# Altium footprint library Footprint-Lib-PhilsLab.PcbLib: 237 footprints (part 7 of 15)
Each footprint in its own frame and in the unit in brackets; x right, y up, seen from the top. Pads: shape width x height; smd on the part's side, far side on the other; paste and mask are expansions set on the pad; w line width, h text height; cw(c..) or ccw(c..) is an arc to the next point about the centre after c.
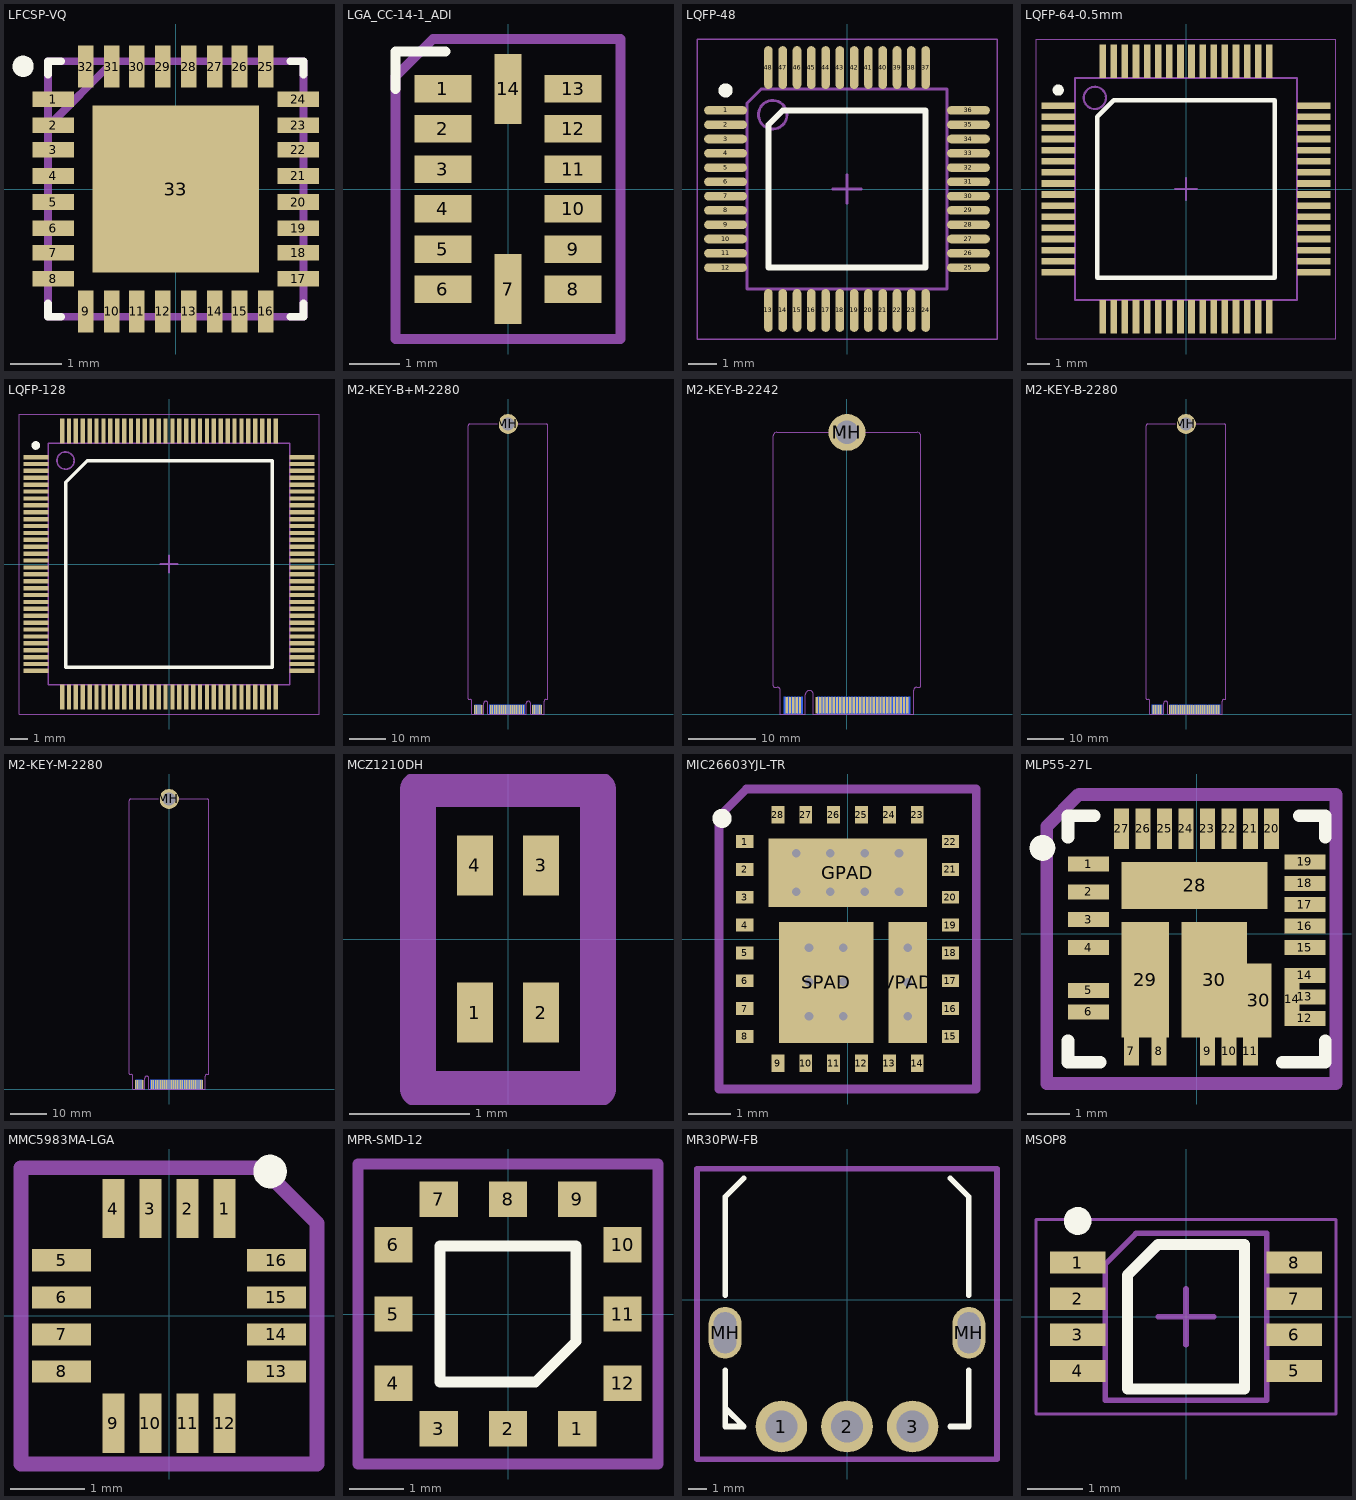
[diagram p6: the footprints below, top view; thin cyan lines are the x and y axes]

## LFCSP-VQ [mil]
pads (33):
  rect 32x12 smd mask+1.97: 1(-94,69) 2(-94,49) 3(-94,30) 4(-94,10) 5(-94,-10) 6(-94,-30) 7(-94,-49) 8(-94,-69) 17(94,-69) 18(94,-49) 19(94,-30) 20(94,-10) 21(94,10) 22(94,30) 23(94,49) 24(94,69)
  rect 12x32 smd mask+1.97: 9(-69,-94) 10(-49,-94) 11(-30,-94) 12(-10,-94) 13(10,-94) 14(30,-94) 15(49,-94) 16(69,-94) 25(69,94) 26(49,94) 27(30,94) 28(10,94) 29(-10,94) 30(-30,94) 31(-49,94) 32(-69,94)
  rect 128x128 smd mask+1.97: 33(0,0)
Top Overlay:
  circle w10: c-117.13,94.18 r3.15
  lines w6: -98,-88 -98,-98 -88,-98 ; -98,88 -98,98 -88,98 ; 88,-98 98,-98 98,-88 ; 88,98 98,98 98,88
Mechanical 13:
  lines w6: -98,-75 -98,-63 ; -98,-55 -98,-43 ; -98,-36 -98,-24 ; -98,-16 -98,-4 ; -98,4 -98,16 ; -98,24 -98,36 ; -98,43 -98,55 ; -98,48 -48,98 ; -98,63 -98,75 ; -75,-98 -63,-98 ; -75,98 -63,98 ; -55,-98 -43,-98 ; -55,98 -43,98 ; -36,-98 -24,-98 ; -36,98 -24,98 ; -16,-98 -4,-98 ; -16,98 -4,98 ; 4,-98 16,-98 ; 4,98 16,98 ; 24,-98 36,-98 ; 24,98 36,98 ; 43,-98 55,-98 ; 43,98 55,98 ; 63,-98 75,-98 ; 63,98 75,98 ; 98,-75 98,-63 ; 98,-55 98,-43 ; 98,-36 98,-24 ; 98,-16 98,-4 ; 98,4 98,16 ; 98,24 98,36 ; 98,43 98,55 ; 98,63 98,75 ; -98,-98 -98,98 98,98 98,-98 -98,-98
  text "'.Designator'" at -284.69,-42.8 h49.21
3D body "32-LFCSP-VQ.step": height 39.09, standoff 0, extent -98.5,-98.5 98.5,98.5

## LGA_CC-14-1_ADI [mm]
pads (14):
  rect 1.145x0.55 smd mask+0.05: 1(-1.3,2) 2(-1.3,1.2) 3(-1.3,0.4) 4(-1.3,-0.4) 5(-1.3,-1.2) 6(-1.3,-2) 8(1.3,-2) 9(1.3,-1.2) 10(1.3,-0.4) 11(1.3,0.4) 12(1.3,1.2) 13(1.3,2)
  rect 0.55x1.4 smd mask+0.05: 7(0,-2) 14(0,2)
Top Overlay:
  lines w0.2: -2.25,2 -2.25,2.75 -1.25,2.75
Mechanical 13:
  lines w0.2: -2.25,-3 -2.25,-1 -2.25,2.25 -1.5,3 2.25,3 2.25,-3 -2.25,-3
  text "'.Designator'" at -5.84,-0.925 h1
3D body "LGA_CC-14-1_ADI.step": height 1.02, standoff 0, extent -1.625,-2.5 1.625,2.5

## LQFP-48 [mm]
height 1.6
pads (48):
  oval 1.5x0.3 smd mask+0.15: 1(-4.25,2.75) 2(-4.25,2.25) 3(-4.25,1.75) 4(-4.25,1.25) 5(-4.25,0.75) 6(-4.25,0.25) 7(-4.25,-0.25) 8(-4.25,-0.75) 9(-4.25,-1.25) 10(-4.25,-1.75) 11(-4.25,-2.25) 12(-4.25,-2.75) 25(4.25,-2.75) 26(4.25,-2.25) 27(4.25,-1.75) 28(4.25,-1.25) 29(4.25,-0.75) 30(4.25,-0.25) 31(4.25,0.25) 32(4.25,0.75) 33(4.25,1.25) 34(4.25,1.75) 35(4.25,2.25) 36(4.25,2.75)
  oval 0.3x1.5 smd mask+0.15: 13(-2.75,-4.25) 14(-2.25,-4.25) 15(-1.75,-4.25) 16(-1.25,-4.25) 17(-0.75,-4.25) 18(-0.25,-4.25) 19(0.25,-4.25) 20(0.75,-4.25) 21(1.25,-4.25) 22(1.75,-4.25) 23(2.25,-4.25) 24(2.75,-4.25) 37(2.75,4.25) 38(2.25,4.25) 39(1.75,4.25) 40(1.25,4.25) 41(0.75,4.25) 42(0.25,4.25) 43(-0.25,4.25) 44(-0.75,4.25) 45(-1.25,4.25) 46(-1.75,4.25) 47(-2.25,4.25) 48(-2.75,4.25)
Top Overlay:
  circle w0.25: c-4.25,3.45 r0.125
  lines w0.2: -2.75,-2.75 2.75,-2.75 2.75,2.75 -2.25,2.75 -2.75,2.25 -2.75,-2.75
Mechanical 13:
  circle w0.1: c-2.6,2.6 r0.5
  lines w0.1: -3.5,-3.5 3.5,-3.5 3.5,3.5 -3,3.5 -3.5,3 -3.5,-3.5
  text "'.Designator'" at -6.315,-1.4 h1
Mechanical 15:
  lines w0.05: -5.25,-5.25 -5.25,5.25 5.25,5.25 5.25,-5.25 -5.25,-5.25
  lines w0.1: -0.5,0 0.5,0 ; 0,-0.5 0,0.5
3D body "LQFP-48.step": height 1.6, standoff 0, extent -4.5,-4.5 4.5,4.5

## LQFP-64-0.5mm [mm] "TSQFP, 64-Leads, Body 10.00x10.00mm, Pitch 0.50mm, IPC Medium Density"
height 1.6
pads (64):
  rect 1.5x0.3 smd mask+0.05: 1(-5.75,3.75) 2(-5.75,3.25) 3(-5.75,2.75) 4(-5.75,2.25) 5(-5.75,1.75) 6(-5.75,1.25) 7(-5.75,0.75) 8(-5.75,0.25) 9(-5.75,-0.25) 10(-5.75,-0.75) 11(-5.75,-1.25) 12(-5.75,-1.75) 13(-5.75,-2.25) 14(-5.75,-2.75) 15(-5.75,-3.25) 16(-5.75,-3.75) 33(5.75,-3.75) 34(5.75,-3.25) 35(5.75,-2.75) 36(5.75,-2.25) 37(5.75,-1.75) 38(5.75,-1.25) 39(5.75,-0.75) 40(5.75,-0.25) 41(5.75,0.25) 42(5.75,0.75) 43(5.75,1.25) 44(5.75,1.75) 45(5.75,2.25) 46(5.75,2.75) 47(5.75,3.25) 48(5.75,3.75)
  rect 0.3x1.5 smd mask+0.05: 17(-3.75,-5.75) 18(-3.25,-5.75) 19(-2.75,-5.75) 20(-2.25,-5.75) 21(-1.75,-5.75) 22(-1.25,-5.75) 23(-0.75,-5.75) 24(-0.25,-5.75) 25(0.25,-5.75) 26(0.75,-5.75) 27(1.25,-5.75) 28(1.75,-5.75) 29(2.25,-5.75) 30(2.75,-5.75) 31(3.25,-5.75) 32(3.75,-5.75) 49(3.75,5.75) 50(3.25,5.75) 51(2.75,5.75) 52(2.25,5.75) 53(1.75,5.75) 54(1.25,5.75) 55(0.75,5.75) 56(0.25,5.75) 57(-0.25,5.75) 58(-0.75,5.75) 59(-1.25,5.75) 60(-1.75,5.75) 61(-2.25,5.75) 62(-2.75,5.75) 63(-3.25,5.75) 64(-3.75,5.75)
Top Overlay:
  circle w0.25: c-5.75,4.45 r0.125
  lines w0.2: -4,-4 4,-4 4,4 -3.25,4 -4,3.25 -4,-4
Mechanical 13:
  circle w0.1: c-4.1,4.1 r0.5
  lines w0.1: -5,-5 5,-5 5,5 -5,5 -5,-5
Mechanical 15:
  lines w0.05: -6.75,-6.75 6.75,-6.75 6.75,6.75 -6.75,6.75 -6.75,-6.75
  lines w0.1: -0.5,0 0.5,0 ; 0,-0.5 0,0.5
3D body "LQFP-64-0.5mm.step": height 1.6, standoff 0, extent -6,-6 6,6

## LQFP-128 [mm] "CQFP, 128-Leads, Body 16,00x16,00mm, Pitch 0,40mm, IPC Medium Density"
height 1.6
pads (128):
  rect 1.45x0.25 smd mask+0.05: 1(-7.725,6.2) 2(-7.725,5.8) 3(-7.725,5.4) 4(-7.725,5) 5(-7.725,4.6) 6(-7.725,4.2) 7(-7.725,3.8) 8(-7.725,3.4) 9(-7.725,3) 10(-7.725,2.6) 11(-7.725,2.2) 12(-7.725,1.8) 13(-7.725,1.4) 14(-7.725,1) 15(-7.725,0.6) 16(-7.725,0.2) 17(-7.725,-0.2) 18(-7.725,-0.6) 19(-7.725,-1) 20(-7.725,-1.4) 21(-7.725,-1.8) 22(-7.725,-2.2) 23(-7.725,-2.6) 24(-7.725,-3) 25(-7.725,-3.4) 26(-7.725,-3.8) 27(-7.725,-4.2) 28(-7.725,-4.6) 29(-7.725,-5) 30(-7.725,-5.4) 31(-7.725,-5.8) 32(-7.725,-6.2) 65(7.725,-6.2) 66(7.725,-5.8) 67(7.725,-5.4) 68(7.725,-5) 69(7.725,-4.6) 70(7.725,-4.2) 71(7.725,-3.8) 72(7.725,-3.4) 73(7.725,-3) 74(7.725,-2.6) 75(7.725,-2.2) 76(7.725,-1.8) 77(7.725,-1.4) 78(7.725,-1) 79(7.725,-0.6) 80(7.725,-0.2) 81(7.725,0.2) 82(7.725,0.6) 83(7.725,1) 84(7.725,1.4) 85(7.725,1.8) 86(7.725,2.2) 87(7.725,2.6) 88(7.725,3) 89(7.725,3.4) 90(7.725,3.8) 91(7.725,4.2) 92(7.725,4.6) 93(7.725,5) 94(7.725,5.4) 95(7.725,5.8) 96(7.725,6.2)
  rect 0.25x1.45 smd mask+0.05: 33(-6.2,-7.725) 34(-5.8,-7.725) 35(-5.4,-7.725) 36(-5,-7.725) 37(-4.6,-7.725) 38(-4.2,-7.725) 39(-3.8,-7.725) 40(-3.4,-7.725) 41(-3,-7.725) 42(-2.6,-7.725) 43(-2.2,-7.725) 44(-1.8,-7.725) 45(-1.4,-7.725) 46(-1,-7.725) 47(-0.6,-7.725) 48(-0.2,-7.725) 49(0.2,-7.725) 50(0.6,-7.725) 51(1,-7.725) 52(1.4,-7.725) 53(1.8,-7.725) 54(2.2,-7.725) 55(2.6,-7.725) 56(3,-7.725) 57(3.4,-7.725) 58(3.8,-7.725) 59(4.2,-7.725) 60(4.6,-7.725) 61(5,-7.725) 62(5.4,-7.725) 63(5.8,-7.725) 64(6.2,-7.725) 97(6.2,7.725) 98(5.8,7.725) 99(5.4,7.725) 100(5,7.725) 101(4.6,7.725) 102(4.2,7.725) 103(3.8,7.725) 104(3.4,7.725) 105(3,7.725) 106(2.6,7.725) 107(2.2,7.725) 108(1.8,7.725) 109(1.4,7.725) 110(1,7.725) 111(0.6,7.725) 112(0.2,7.725) 113(-0.2,7.725) 114(-0.6,7.725) 115(-1,7.725) 116(-1.4,7.725) 117(-1.8,7.725) 118(-2.2,7.725) 119(-2.6,7.725) 120(-3,7.725) 121(-3.4,7.725) 122(-3.8,7.725) 123(-4.2,7.725) 124(-4.6,7.725) 125(-5,7.725) 126(-5.4,7.725) 127(-5.8,7.725) 128(-6.2,7.725)
Top Overlay:
  circle w0.25: c-7.725,6.875 r0.125
  lines w0.2: -6,-6 6,-6 6,6 -4.75,6 -6,4.75 -6,-6
Mechanical 13:
  circle w0.1: c-6,6 r0.5
  lines w0.1: -7,-7 7,-7 7,7 -7,7 -7,-7
  text "'.Designator'" at -5.84,-0.925 h1
Mechanical 15:
  lines w0.05: -8.7,-8.7 8.7,-8.7 8.7,8.7 -8.7,8.7 -8.7,-8.7
  lines w0.1: -0.5,0 0.5,0 ; 0,-0.5 0,0.5
3D body "CQFP40P1600X1600X160-128N.step": height 1.55, standoff 0, extent -8.1,-8.1 8.1,8.1

## M2-KEY-B+M-2280 [mm]
pads (60):
  rect 0.35x2.5 smd: 1(9.25,1.3) 3(8.75,1.3) 5(8.25,1.3) 7(7.75,1.3) 9(7.25,1.3) 11(6.75,1.3) 21(4.25,1.3) 23(3.75,1.3) 25(3.25,1.3) 27(2.75,1.3) 29(2.25,1.3) 31(1.75,1.3) 33(1.25,1.3) 35(0.75,1.3) 37(0.25,1.3) 39(-0.25,1.3) 41(-0.75,1.3) 43(-1.25,1.3) 45(-1.75,1.3) 47(-2.25,1.3) 49(-2.75,1.3) 51(-3.25,1.3) 53(-3.75,1.3) 55(-4.25,1.3) 57(-4.75,1.3) 67(-7.25,1.3) 69(-7.75,1.3) 71(-8.25,1.3) 73(-8.75,1.3) 75(-9.25,1.3)
  rect 0.35x2.5 smd far side: 2(9,1.3) 4(8.5,1.3) 6(8,1.3) 8(7.5,1.3) 10(7,1.3) 20(4.5,1.3) 22(4,1.3) 24(3.5,1.3) 26(3,1.3) 28(2.5,1.3) 30(2,1.3) 32(1.5,1.3) 34(1,1.3) 36(0.5,1.3) 38(0,1.3) 40(-0.5,1.3) 42(-1,1.3) 44(-1.5,1.3) 46(-2,1.3) 48(-2.5,1.3) 50(-3,1.3) 52(-3.5,1.3) 54(-4,1.3) 56(-4.5,1.3) 58(-5,1.3) 68(-7.5,1.3) 70(-8,1.3) 72(-8.5,1.3) 74(-9,1.3)
  round 5.5 hole 3.5: MH(0,80)
Mechanical 13:
  lines w0.1: -11,4.2 ccw(c-10.8,4.2) -10.8,4 -10.4,4 cw(c-10.4,3.55) -9.95,3.55 -9.95,0 -6.725,0 -6.725,2.9 cw(c-6.125,2.9) -5.525,2.9 -5.525,0 5.025,0 5.025,2.9 cw(c5.625,2.9) 6.225,2.9 6.225,0 9.95,0 9.95,3.55 cw(c10.4,3.55) 10.4,4 10.8,4 ccw(c10.8,4.2) 11,4.2 11,79.5 ccw(c10.5,79.5) 10.5,80 -10.5,80 ccw(c-10.5,79.5) -11,79.5 -11,4.2
  text "TOP" at -1.983,74.35 h1
  text "M" at -6.583,3.75 h1
  text "B" at 5.117,3.75 h1

## M2-KEY-B-2242 [mm]
pads (68):
  rect 0.35x2.5 smd far side: 1(-9.25,1.3) 3(-8.75,1.3) 5(-8.25,1.3) 7(-7.75,1.3) 9(-7.25,1.3) 11(-6.75,1.3) 21(-4.25,1.3) 23(-3.75,1.3) 25(-3.25,1.3) 27(-2.75,1.3) 29(-2.25,1.3) 31(-1.75,1.3) 33(-1.25,1.3) 35(-0.75,1.3) 37(-0.25,1.3) 39(0.25,1.3) 41(0.75,1.3) 43(1.25,1.3) 45(1.75,1.3) 47(2.25,1.3) 49(2.75,1.3) 51(3.25,1.3) 53(3.75,1.3) 55(4.25,1.3) 57(4.75,1.3) 59(5.25,1.3) 61(5.75,1.3) 63(6.25,1.3) 65(6.75,1.3) 67(7.25,1.3) 69(7.75,1.3) 71(8.25,1.3) 73(8.75,1.3) 75(9.25,1.3)
  rect 0.35x2.5 smd: 2(-9,1.3) 4(-8.5,1.3) 6(-8,1.3) 8(-7.5,1.3) 10(-7,1.3) 20(-4.5,1.3) 22(-4,1.3) 24(-3.5,1.3) 26(-3,1.3) 28(-2.5,1.3) 30(-2,1.3) 32(-1.5,1.3) 34(-1,1.3) 36(-0.5,1.3) 38(0,1.3) 40(0.5,1.3) 42(1,1.3) 44(1.5,1.3) 46(2,1.3) 48(2.5,1.3) 50(3,1.3) 52(3.5,1.3) 54(4,1.3) 56(4.5,1.3) 58(5,1.3) 60(5.5,1.3) 62(6,1.3) 64(6.5,1.3) 66(7,1.3) 68(7.5,1.3) 70(8,1.3) 72(8.5,1.3) 74(9,1.3)
  round 5.5 hole 3.5: MH(0,42)
Mechanical 13:
  lines w0.1: -6.2,0 -6.2,2.9 cw(c-5.6,2.9) -5,2.9 -5,0 9.95,0 9.95,3.55 cw(c10.4,3.55) 10.4,4 10.8,4 ccw(c10.8,4.2) 11,4.2 11,41.5 ccw(c10.5,41.5) 10.5,42 -10.5,42 ccw(c-10.5,41.5) -11,41.5 -11,4.2 ccw(c-10.8,4.2) -10.8,4 -10.4,4 cw(c-10.4,3.55) -9.95,3.55 -9.95,0 -6.209,0 -6.2,0.009
  text "TOP" at -1.983,36.35 h1

## M2-KEY-B-2280 [mm]
pads (68):
  rect 0.35x2.5 smd far side: 1(-9.25,1.3) 3(-8.75,1.3) 5(-8.25,1.3) 7(-7.75,1.3) 9(-7.25,1.3) 11(-6.75,1.3) 21(-4.25,1.3) 23(-3.75,1.3) 25(-3.25,1.3) 27(-2.75,1.3) 29(-2.25,1.3) 31(-1.75,1.3) 33(-1.25,1.3) 35(-0.75,1.3) 37(-0.25,1.3) 39(0.25,1.3) 41(0.75,1.3) 43(1.25,1.3) 45(1.75,1.3) 47(2.25,1.3) 49(2.75,1.3) 51(3.25,1.3) 53(3.75,1.3) 55(4.25,1.3) 57(4.75,1.3) 59(5.25,1.3) 61(5.75,1.3) 63(6.25,1.3) 65(6.75,1.3) 67(7.25,1.3) 69(7.75,1.3) 71(8.25,1.3) 73(8.75,1.3) 75(9.25,1.3)
  rect 0.35x2.5 smd: 2(-9,1.3) 4(-8.5,1.3) 6(-8,1.3) 8(-7.5,1.3) 10(-7,1.3) 20(-4.5,1.3) 22(-4,1.3) 24(-3.5,1.3) 26(-3,1.3) 28(-2.5,1.3) 30(-2,1.3) 32(-1.5,1.3) 34(-1,1.3) 36(-0.5,1.3) 38(0,1.3) 40(0.5,1.3) 42(1,1.3) 44(1.5,1.3) 46(2,1.3) 48(2.5,1.3) 50(3,1.3) 52(3.5,1.3) 54(4,1.3) 56(4.5,1.3) 58(5,1.3) 60(5.5,1.3) 62(6,1.3) 64(6.5,1.3) 66(7,1.3) 68(7.5,1.3) 70(8,1.3) 72(8.5,1.3) 74(9,1.3)
  round 5.5 hole 3.5: MH(0,80)
Mechanical 13:
  lines w0.1: -6.2,0 -6.2,2.9 cw(c-5.6,2.9) -5,2.9 -5,0 9.95,0 9.95,3.55 cw(c10.4,3.55) 10.4,4 10.8,4 ccw(c10.8,4.2) 11,4.2 11,79.5 ccw(c10.5,79.5) 10.5,80 -10.5,80 ccw(c-10.5,79.5) -11,79.5 -11,4.2 ccw(c-10.8,4.2) -10.8,4 -10.4,4 cw(c-10.4,3.55) -9.95,3.55 -9.95,0 -6.209,0 -6.2,0.009
  text "TOP" at -1.983,74.35 h1

## M2-KEY-M-2280 [mm]
pads (68):
  rect 0.35x2.5 smd: 1(9.25,1.3) 3(8.75,1.3) 5(8.25,1.3) 7(7.75,1.3) 9(7.25,1.3) 11(6.75,1.3) 13(6.25,1.3) 15(5.75,1.3) 17(5.25,1.3) 19(4.75,1.3) 21(4.25,1.3) 23(3.75,1.3) 25(3.25,1.3) 27(2.75,1.3) 29(2.25,1.3) 31(1.75,1.3) 33(1.25,1.3) 35(0.75,1.3) 37(0.25,1.3) 39(-0.25,1.3) 41(-0.75,1.3) 43(-1.25,1.3) 45(-1.75,1.3) 47(-2.25,1.3) 49(-2.75,1.3) 51(-3.25,1.3) 53(-3.75,1.3) 55(-4.25,1.3) 57(-4.75,1.3) 67(-7.25,1.3) 69(-7.75,1.3) 71(-8.25,1.3) 73(-8.75,1.3) 75(-9.25,1.3)
  rect 0.35x2.5 smd far side: 2(9,1.3) 4(8.5,1.3) 6(8,1.3) 8(7.5,1.3) 10(7,1.3) 12(6.5,1.3) 14(6,1.3) 16(5.5,1.3) 18(5,1.3) 20(4.5,1.3) 22(4,1.3) 24(3.5,1.3) 26(3,1.3) 28(2.5,1.3) 30(2,1.3) 32(1.5,1.3) 34(1,1.3) 36(0.5,1.3) 38(0,1.3) 40(-0.5,1.3) 42(-1,1.3) 44(-1.5,1.3) 46(-2,1.3) 48(-2.5,1.3) 50(-3,1.3) 52(-3.5,1.3) 54(-4,1.3) 56(-4.5,1.3) 58(-5,1.3) 68(-7.5,1.3) 70(-8,1.3) 72(-8.5,1.3) 74(-9,1.3)
  round 5.5 hole 3.5: MH(0,80)
Mechanical 13:
  lines w0.1: -11,4.2 ccw(c-10.8,4.2) -10.8,4 -10.4,4 cw(c-10.4,3.55) -9.95,3.55 -9.95,0 -6.725,0 -6.725,2.9 cw(c-6.125,2.9) -5.525,2.9 -5.525,0 6.225,0 9.95,0 9.95,3.55 cw(c10.4,3.55) 10.4,4 10.8,4 ccw(c10.8,4.2) 11,4.2 11,79.5 ccw(c10.5,79.5) 10.5,80 -10.5,80 ccw(c-10.5,79.5) -11,79.5 -11,4.2
  text "TOP" at -1.983,74.35 h1
  text "M" at -6.583,3.75 h1

## MCZ1210DH [mm]
pads (4):
  rect 0.3x0.5 smd mask+0.07: 1(-0.275,-0.613) 2(0.275,-0.613) 3(0.275,0.613) 4(-0.275,0.613)
Mechanical 13:
  lines w0.3: -0.75,-1.25 -0.75,0 -0.75,1.25 0.75,1.25 0.75,-1.25 -0.75,-1.25
  text "'.Designator'" at -5.84,-0.925 h1
3D body "MCZ1210DH.stp": height 0.7, standoff 0, extent -0.5,-0.833 0.5,0.833

## MIC26603YJL-TR [mm]
pads (31):
  rect 0.4x0.3 smd mask+0.07: 1(-2.4,2.275) 2(-2.4,1.625) 3(-2.4,0.975) 4(-2.4,0.325) 5(-2.4,-0.325) 6(-2.4,-0.975) 7(-2.4,-1.625) 8(-2.4,-2.275) 15(2.4,-2.275) 16(2.4,-1.625) 17(2.4,-0.975) 18(2.4,-0.325) 19(2.4,0.325) 20(2.4,0.975) 21(2.4,1.625) 22(2.4,2.275)
  rect 0.3x0.4 smd mask+0.07: 9(-1.625,-2.9) 10(-0.975,-2.9) 11(-0.325,-2.9) 12(0.325,-2.9) 13(0.975,-2.9) 14(1.625,-2.9) 23(1.625,2.9) 24(0.975,2.9) 25(0.325,2.9) 26(-0.325,2.9) 27(-0.975,2.9) 28(-1.625,2.9)
  rect 3.7x1.6 smd mask+0.07: GPAD(0,1.55)
  rect 2.2x2.83 smd mask+0.07: SPAD(-0.5,-1.015)
  rect 0.9x2.83 smd mask+0.07: VPAD(1.4,-1.015)
via 1.4,-1.8 diameter 0.5 hole 0.2
via 1.4,-1.015 diameter 0.5 hole 0.2
via 1.4,-0.2 diameter 0.5 hole 0.2
via -0.1,-1 diameter 0.5 hole 0.2
via -0.9,-1 diameter 0.5 hole 0.2
via -0.1,-0.2 diameter 0.5 hole 0.2
via -0.9,-0.2 diameter 0.5 hole 0.2
via -0.9,-1.8 diameter 0.5 hole 0.2
via -0.1,-1.8 diameter 0.5 hole 0.2
via 0.4,2 diameter 0.5 hole 0.2
via 0.4,1.1 diameter 0.5 hole 0.2
via 1.2,1.1 diameter 0.5 hole 0.2
via 1.2,2 diameter 0.5 hole 0.2
via -0.4,2 diameter 0.5 hole 0.2
via -0.4,1.1 diameter 0.5 hole 0.2
via -1.2,1.1 diameter 0.5 hole 0.2
via -1.2,2 diameter 0.5 hole 0.2
Top Overlay:
  circle w0.25: c-2.929,2.814 r0.098
Mechanical 13:
  lines w0.2: -3,-3.5 3,-3.5 3,3.5 -2.359,3.5 -3,2.859 -3,-3.5
  text "'.Designator'" at -5.148,-0.75 h0.8
3D body "MIC26603YJL-TR.stp": height 1, standoff 0, extent -2.5,-3 2.5,3

## MLP55-27L [mm]
pads (32):
  rect 0.95x0.35 smd mask+0.1: 1(-2.525,1.625) 2(-2.525,0.975) 3(-2.525,0.325) 4(-2.525,-0.325) 5(-2.525,-1.325) 6(-2.525,-1.825) 12(2.525,-1.975) 13(2.525,-1.475) 14(2.525,-0.975) 15(2.525,-0.325) 16(2.525,0.175) 17(2.525,0.675) 18(2.525,1.175) 19(2.525,1.675)
  rect 0.35x0.65 smd mask+0.1: 7(-1.525,-2.75) 8(-0.875,-2.75) 9(0.255,-2.75) 10(0.755,-2.75) 11(1.255,-2.75)
  rect 0.35x0.95 smd mask+0.05: 14(2.225,-1.525)
  rect 0.35x0.95 smd mask+0.1: 20(1.75,2.45) 21(1.25,2.45) 22(0.75,2.45) 23(0.25,2.45) 24(-0.25,2.45) 25(-0.75,2.45) 26(-1.25,2.45) 27(-1.75,2.45)
  rect 3.4x1.1 smd mask+0.05: 28(-0.05,1.125)
  rect 1.1x2.7 smd mask+0.05: 29(-1.2,-1.075)
  rect 1.52x2.7 smd mask+0.05: 30(0.41,-1.075)
  rect 0.58x1.73 smd mask+0.05: 30(1.45,-1.56)
Top Overlay:
  circle w0.3: c-3.6,2 r0.15
  lines w0.3: -3,-2.5 -3,-3 -2.25,-3 ; -3,2.25 -3,2.75 -2.4,2.75 ; 2,-3 3,-3 3,-2.5 ; 2.4,2.75 3,2.75 3,2.25
Mechanical 13:
  lines w0.3: -3.5,-3.5 -3.5,2.5 -2.75,3.25 3.25,3.25 3.25,-3.5 -3.5,-3.5
  text "'.Designator'" at -6.315,-1.4 h1
3D body "MLP55-27L.STEP": height 0.8, standoff 0, extent -2.5,-2.575 2.501,2.425

## MMC5983MA-LGA [mm]
pads (16):
  rect 0.3x0.8 smd mask+0.05: 1(0.75,1.45) 2(0.25,1.45) 3(-0.25,1.45) 4(-0.75,1.45) 9(-0.75,-1.45) 10(-0.25,-1.45) 11(0.25,-1.45) 12(0.75,-1.45)
  rect 0.8x0.3 smd mask+0.05: 5(-1.45,0.75) 6(-1.45,0.25) 7(-1.45,-0.25) 8(-1.45,-0.75) 13(1.45,-0.75) 14(1.45,-0.25) 15(1.45,0.25) 16(1.45,0.75)
Top Overlay:
  circle w0.25: c1.364,1.95 r0.101
Mechanical 13:
  lines w0.2: -2,-2 -2,-0.25 -2,2 1.25,2 2,1.25 2,-2 -2,-2
3D body "MMC5983MA.step": height 0.99, standoff 0, extent -1.549,-1.549 1.549,1.549

## MPR-SMD-12 [mm]
pads (12):
  rect 0.7x0.65 smd mask+0.03: 1(1.27,-2.1) 2(0,-2.1) 3(-1.27,-2.1) 4(-2.1,-1.27) 5(-2.1,0) 6(-2.1,1.27) 7(-1.27,2.1) 8(0,2.1) 9(1.27,2.1) 10(2.1,1.27) 11(2.1,0) 12(2.1,-1.27)
Top Overlay:
  lines w0.2: -1.25,-1.25 0.5,-1.25 1.25,-0.5 1.25,1.25 -1.25,1.25 -1.25,-1.25
Mechanical 13:
  lines w0.2: -2.75,-2.75 2.75,-2.75 2.75,2.75 -2.75,2.75 -2.75,-2.75
  text "'.Designator'" at -5.84,-0.925 h1
3D body "MPRLS.stp": height 5.83, standoff 0.01, extent -2.444,-2.445 2.446,2.445

## MR30PW-FB [mm]
pads (5):
  round 2.75 hole 1.7: 1(-3.5,-6.75) 2(0,-6.75) 3(3.5,-6.75)
  oval 1.75x2.75 hole 1.2 slot 2.2 at 90 deg: MH(-6.5,-1.75) MH(6.5,-1.75)
Top Overlay:
  lines w0.3: -6.5,-3.75 -6.5,-6.75 -5.5,-6.75 -6.5,-5.75 ; -6.5,0.25 -6.5,5.5 -5.5,6.5 ; 5.5,-6.75 6.5,-6.75 6.5,-4 6.5,-3.75 ; 5.5,6.5 6.5,5.5 6.5,0.25 ; -6.5,-5.75 -6.5,-5.75
Mechanical 13:
  lines w0.3: -8,-8.5 -8,7 8,7 8,-8.5 -8,-8.5
  text "'.Designator'" at -5.84,-0.925 h1
3D body "MR30PW-FB.STEP": height 4.96, standoff -1.99, extent -7.7,-7.7 7.7,6.75

## MSOP8 [mm] "TSOP, 8-Leads, Body 2.90x2.80mm, Pitch 0.65mm, IPC Medium Density"
height 0.9
pads (8):
  rect 1x0.4 smd mask+0.05: 1(-1.95,0.975) 2(-1.95,0.325) 3(-1.95,-0.325) 4(-1.95,-0.975) 5(1.95,-0.975) 6(1.95,-0.325) 7(1.95,0.325) 8(1.95,0.975)
Top Overlay:
  circle w0.25: c-1.95,1.725 r0.125
  lines w0.2: -1.05,-1.3 1.05,-1.3 1.05,1.3 -0.5,1.3 -1.05,0.75 -1.05,-1.3
Mechanical 13:
  lines w0.1: -1.45,-1.5 -1.45,0.95 -0.9,1.5 1.45,1.5 1.45,-1.5 -1.45,-1.5
  text "'.Designator'" at -5.815,-0.9 h1
Mechanical 15:
  lines w0.05: -2.7,-1.75 -2.7,1.75 2.7,1.75 2.7,-1.75 -2.7,-1.75
  lines w0.1: -0.5,0 0.5,0 ; 0,-0.5 0,0.5
3D body "MSOP8.step": height 0.9, standoff 0, extent -2,-1.5 2,1.5